# Altium footprint library 5-C-THD.PcbLib: 166 footprints (part 9 of 11)
Each footprint in its own frame and in the unit in brackets; x right, y up, seen from the top. Pads: shape width x height; smd on the part's side, far side on the other; paste and mask are expansions set on the pad; w line width, h text height; cw(c..) or ccw(c..) is an arc to the next point about the centre after c.
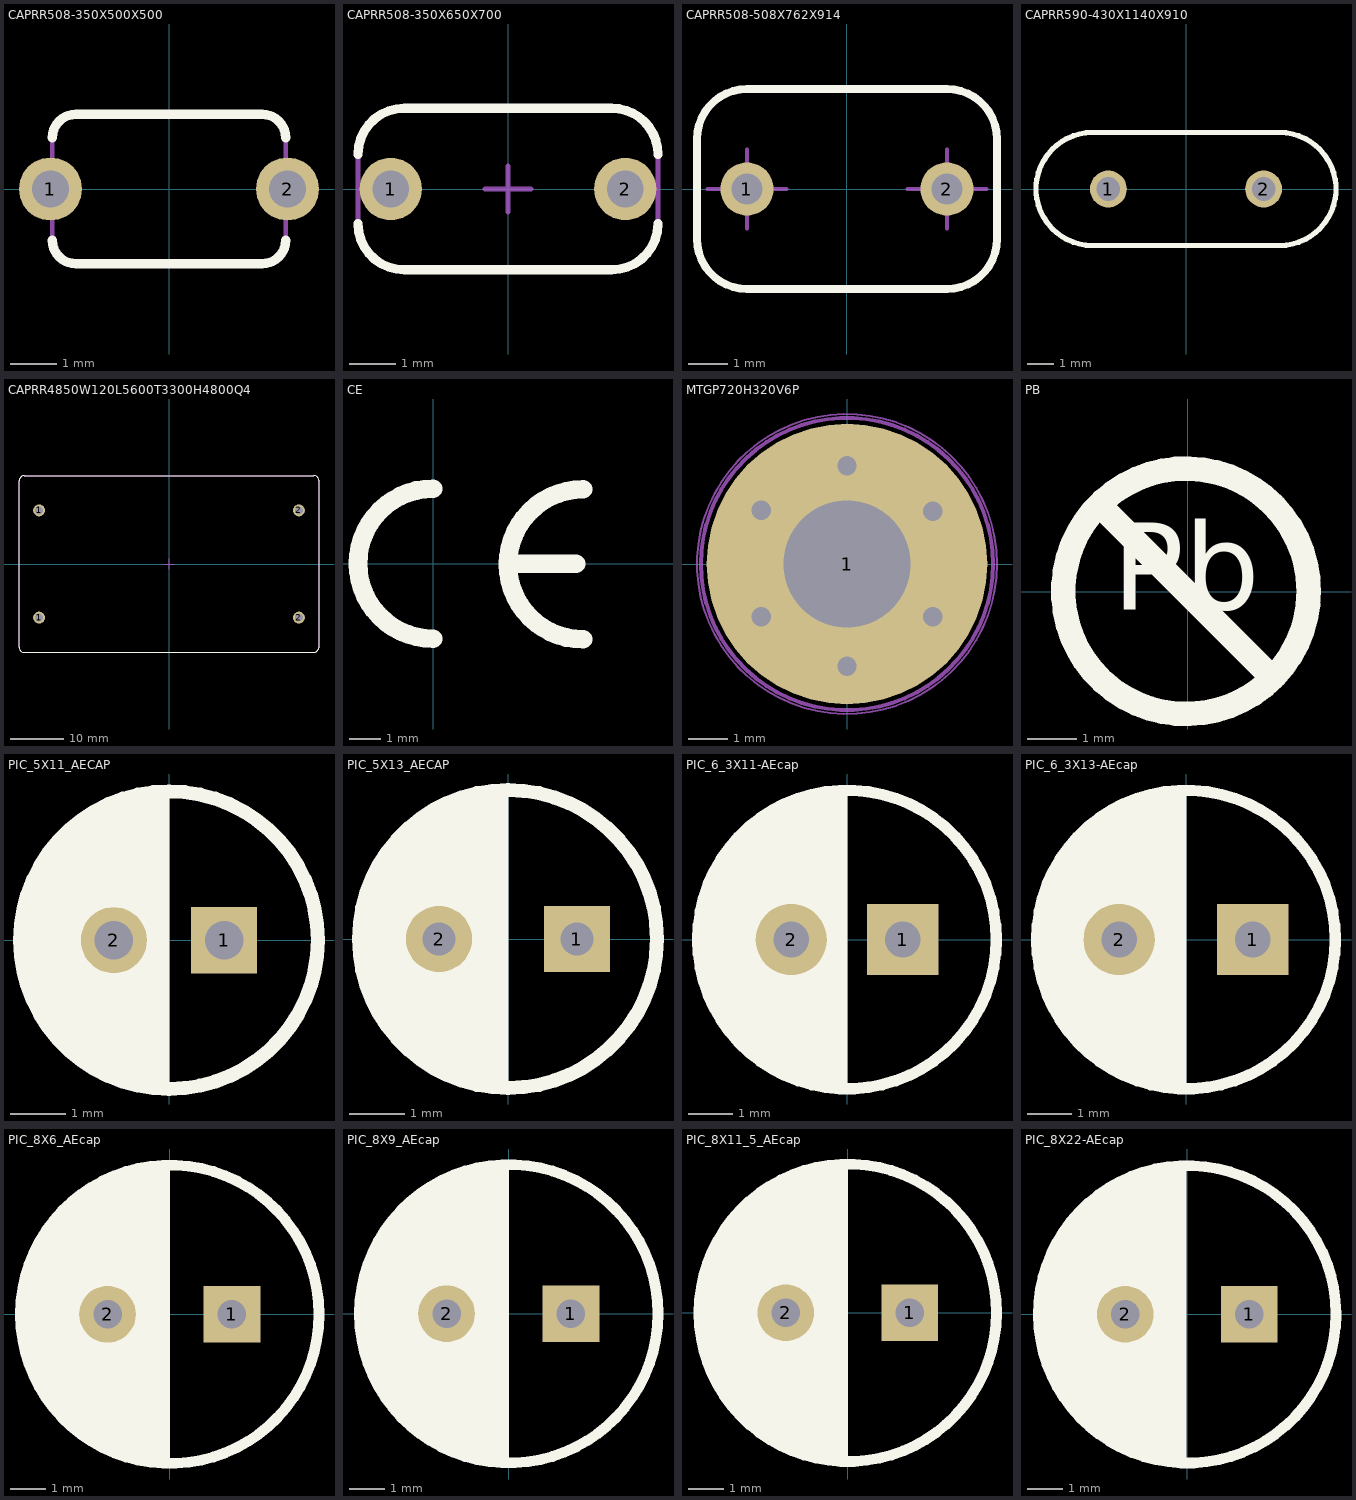
[diagram p8: the footprints below, top view; thin cyan lines are the x and y axes]

## CAPRR508-350X500X500 [mm] "Capacitor Radial Rounded, Pin spacing 5.08mm - Body With 3.2mm X Body Length 5.0mm X Body Height 5.0mm"
height 5
pads (2):
  round 1.35 hole 0.8: 1(-2.54,0) 2(2.54,0)
Top Overlay:
  lines w0.2: -2.5,-1.1 ccw(c-2,-1.1) -2,-1.6 2,-1.6 ccw(c2,-1.1) 2.5,-1.1 ; -2.5,1.1 cw(c-2,1.1) -2,1.6 2,1.6 cw(c2,1.1) 2.5,1.1
Mechanical 13:
  lines w0.1: -2.5,-1.1 ccw(c-2,-1.1) -2,-1.6 2,-1.6 ccw(c2,-1.1) 2.5,-1.1 2.5,1.1 ccw(c2,1.1) 2,1.6 -2,1.6 ccw(c-2,1.1) -2.5,1.1 -2.5,-1.1
Mechanical 14:
  lines w0.1: -2.5,-1.1 ccw(c-2,-1.1) -2,-1.6 2,-1.6 ccw(c2,-1.1) 2.5,-1.1 2.5,1.1 ccw(c2,1.1) 2,1.6 -2,1.6 ccw(c-2,1.1) -2.5,1.1 -2.5,-1.1
3D body "v150-080.stp": height 0.02, standoff -1.65, extent 1.79,-0.75 3.29,0.75
3D body "v150-080.stp": height 0.02, standoff -1.65, extent -3.29,-0.75 -1.79,0.75
3D body "CAPRR508-350X500X500.stp": height 5, standoff -1.94, extent -2.79,-1.75 2.79,1.75

## CAPRR508-350X650X700 [mm] "Capacitor Radial Rounded, Pin spacing 5.08mm - Body With 3.5mm X Body Length 6.5mm X Body Height 7mm"
height 7
pads (2):
  round 1.35 hole 0.8: 1(-2.54,0) 2(2.54,0)
Top Overlay:
  lines w0.2: -3.25,-0.75 ccw(c-2.25,-0.75) -2.25,-1.75 2.25,-1.75 ccw(c2.25,-0.75) 3.25,-0.75 ; -3.25,0.75 cw(c-2.25,0.75) -2.25,1.75 2.25,1.75 cw(c2.25,0.75) 3.25,0.75
Mechanical 8:
  lines w0.1: -3.04,0 -2.54,0 ; -2.54,-0.5 -2.54,0 ; -2.54,0.5 -2.54,0 ; -2.04,0 -2.54,0 ; -0.5,0 0,0 ; 0,-0.5 0,0 ; 0,0.5 0,0 ; 0.5,0 0,0 ; 2.04,0 2.54,0 ; 2.54,-0.5 2.54,0 ; 2.54,0.5 2.54,0 ; 3.04,0 2.54,0
Mechanical 14:
  lines w0.1: -3.25,-0.75 ccw(c-2.25,-0.75) -2.25,-1.75 2.25,-1.75 ccw(c2.25,-0.75) 3.25,-0.75 3.25,0.75 ccw(c2.25,0.75) 2.25,1.75 -2.25,1.75 ccw(c-2.25,0.75) -3.25,0.75 -3.25,-0.75
3D body "v150-080.stp": height 0.02, standoff -1.65, extent -3.29,-0.75 -1.79,0.75
3D body "v150-080.stp": height 0.02, standoff -1.65, extent 1.79,-0.75 3.29,0.75
3D body "CAPRR508-350X650X700.stp": height 7, standoff -3.6, extent -3.25,-1.75 3.25,1.75

## CAPRR508-508X762X914 [mm] "Capacitor Radial Rounded, Pin spacing 5.08mm - Body With 5.08mm X Body Length 7.62mm X Body Height 9.14mm"
height 9.14
pads (2):
  round 1.35 hole 0.8: 1(-2.54,0) 2(2.54,0)
Top Overlay:
  lines w0.2: -3.81,-1.27 ccw(c-2.54,-1.27) -2.54,-2.54 2.54,-2.54 ccw(c2.54,-1.27) 3.81,-1.27 3.81,1.27 ccw(c2.54,1.27) 2.54,2.54 -2.54,2.54 ccw(c-2.54,1.27) -3.81,1.27 -3.81,-1.27
Mechanical 8:
  lines w0.1: -3.54,0 -2.54,0 ; -2.54,-1 -2.54,0 ; -2.54,1 -2.54,0 ; -1.54,0 -2.54,0 ; 1.54,0 2.54,0 ; 2.54,-1 2.54,0 ; 2.54,1 2.54,0 ; 3.54,0 2.54,0
Mechanical 14:
  lines w0.1: -3.81,-1.27 ccw(c-2.54,-1.27) -2.54,-2.54 2.54,-2.54 ccw(c2.54,-1.27) 3.81,-1.27 3.81,1.27 ccw(c2.54,1.27) 2.54,2.54 -2.54,2.54 ccw(c-2.54,1.27) -3.81,1.27 -3.81,-1.27
3D body "v150-080.stp": height 0.02, standoff -1.65, extent 1.79,-0.75 3.29,0.75
3D body "v150-080.stp": height 0.02, standoff -1.65, extent -3.29,-0.75 -1.79,0.75
3D body "CAPRR508-508X762X914.stp": height 9.14, standoff -3.4, extent -3.81,-2.54 3.81,2.54

## CAPRR590-430X1140X910 [mm] "Capacitor Radial Rounded, Pin spacing 5.9mm - Body With 4.3mm X Body Length 11.4mm X Body Height 9.1mm"
height 9.1
pads (2):
  round 1.4 hole 0.9: 1(-2.95,0) 2(2.95,0)
Top Overlay:
  lines w0.2: -3.55,-2.15 cw(c-3.55,0) -3.55,2.15 3.55,2.15 cw(c3.55,0) 3.55,-2.15 -3.55,-2.15
Mechanical 14:
  lines w0.1: -3.55,-2.15 cw(c-3.55,0) -3.55,2.15 3.55,2.15 cw(c3.55,0) 3.55,-2.15 -3.55,-2.15
3D body "CAPRR590-430X1140X910.stp": height 10.95, standoff -4, extent -5.7,-2.15 5.7,2.15
3D body "v150-080.stp": height 0.02, standoff -1.65, extent 2.2,-0.75 3.7,0.75
3D body "v150-080.stp": height 0.02, standoff -1.65, extent -3.7,-0.75 -2.2,0.75

## CAPRR4850W120L5600T3300H4800Q4 [mm] "Capacitor Non Polarized Radial Rectangular, 4 Pin, Lead spacing 48.5mm - Body Length 56mm X Body Thickness 33mm X Body Height 48mm"
height 48
pads (4):
  round 2.2 hole 1.5: 1(-24.25,-10) 1(-24.25,10) 2(24.25,-10) 2(24.25,10)
Top Overlay:
  lines w0.2: -28,-15.5 ccw(c-27,-15.5) -27,-16.5 27,-16.5 ccw(c27,-15.5) 28,-15.5 28,15.5 ccw(c27,15.5) 27,16.5 -27,16.5 ccw(c-27,15.5) -28,15.5 -28,-15.5
Mechanical 8:
  lines w0.1: -25.25,-10 -24.25,-10 ; -25.25,10 -24.25,10 ; -24.25,-11 -24.25,-10 ; -24.25,-9 -24.25,-10 ; -24.25,9 -24.25,10 ; -24.25,11 -24.25,10 ; -23.25,-10 -24.25,-10 ; -23.25,10 -24.25,10 ; -1,0 0,0 ; 0,-1 0,0 ; 0,1 0,0 ; 1,0 0,0 ; 23.25,-10 24.25,-10 ; 23.25,10 24.25,10 ; 24.25,-11 24.25,-10 ; 24.25,-9 24.25,-10 ; 24.25,9 24.25,10 ; 24.25,11 24.25,10 ; 25.25,-10 24.25,-10 ; 25.25,10 24.25,10
Mechanical 14:
  lines w0.1: -28,-15.5 ccw(c-27,-15.5) -27,-16.5 27,-16.5 ccw(c27,-15.5) 28,-15.5 28,15.5 ccw(c27,15.5) 27,16.5 -27,16.5 ccw(c-27,15.5) -28,15.5 -28,-15.5
3D body "CAPRR4850W120L5600T3300H4800Q4.stp": height 48, standoff -3.8, extent -28,-16.5 28,16.5

## CE [mm]
Top Overlay:
  lines w0.6: 0,-2.413 cw(c0,0) 0,2.413 ; 2.53,0 4.6,0 ; 4.826,-2.438 cw(c4.826,-0.025) 4.826,2.388
3D body "ce.stp": height 0.02, standoff 0, extent -2.725,-2.725 4.82,2.725

## MTGP720H320V6P [mm]
pads (1):
  round 7.2 hole 3.25: 1(0,0)
via -2.2,-1.35 diameter 1 hole 0.5
via -2.2,1.375 diameter 1 hole 0.5
via 0,2.525 diameter 1 hole 0.5
via 2.2,1.35 diameter 1 hole 0.5
via 0,-2.625 diameter 1 hole 0.5
via 2.2,-1.35 diameter 1 hole 0.5
Mechanical 8:
  circle w0.1: c0,0 r2.6
  circle w0.1: c0,0 r3.75
  lines w0.1: -2.657,1.625 -2.224,1.375 ; -2.632,-1.6 -2.199,-1.35 ; -2.474,0.942 -2.224,1.375 ; -2.449,-0.917 -2.199,-1.35 ; -1.974,1.808 -2.224,1.375 ; -1.949,-1.783 -2.199,-1.35 ; -1.791,1.125 -2.224,1.375 ; -1.766,-1.1 -2.199,-1.35 ; -0.5,-2.625 0,-2.625 ; -0.5,0 0,0 ; -0.5,2.525 0,2.525 ; 0,-3.125 0,-2.625 ; 0,-2.125 0,-2.625 ; 0,-0.5 0,0 ; 0,0.5 0,0 ; 0,2.025 0,2.525 ; 0,3.025 0,2.525 ; 0.5,-2.625 0,-2.625 ; 0.5,0 0,0 ; 0.5,2.525 0,2.525 ; 1.766,-1.1 2.199,-1.35 ; 1.766,1.1 2.199,1.35 ; 1.949,-1.783 2.199,-1.35 ; 1.949,1.783 2.199,1.35 ; 2.449,-0.917 2.199,-1.35 ; 2.449,0.917 2.199,1.35 ; 2.632,-1.6 2.199,-1.35 ; 2.632,1.6 2.199,1.35
Mechanical 14:
  circle w0.1: c0,0 r3.75
Mechanical 15:
  circle w0.05: c0,0 r3.85
3D body "mtgp720h320v6p.stp": height 0.1, standoff -1.75, extent -3.627,-3.627 3.628,3.628

## PB [mm]
Top Overlay:
  circle w0.5: c-0.031,0.013 r2.5
  lines w0.5: -1.737,1.719 1.675,-1.693
  text "Pb" at -1.536,-0.948 h3.05
3D body "pb.stp": height 0.02, standoff 0, extent -2.725,-2.725 2.725,2.725

## PIC_5X11_AECAP [mm]
height 45
pads (2):
  rect 1.2x1.2 hole 0.7 mask+0.051: 1(1,0)
  round 1.2 hole 0.7 mask+0.051: 2(-1,0)
Top Overlay:
  circle w0.254: c0,0 r2.7
  region: 0,-2.692 -1.016,-2.489 -1.854,-1.956 -2.438,-1.143 -2.692,-0.152 -2.642,0.762 -2.108,1.753 -1.448,2.311 -0.787,2.642 -0.178,2.743 0,2.718
3D body "pic_5x11-aecap.stp": height 11, standoff -2.24, extent -2.505,-2.51 2.5,2.49

## PIC_5X13_AECAP [mm]
height 45
pads (2):
  rect 1.2x1.2 hole 0.6 mask+0.051: 1(1.25,0)
  round 1.2 hole 0.6 mask+0.051: 2(-1.25,0)
Top Overlay:
  circle w0.254: c0,0 r2.7
  region: 0,-2.718 -1.016,-2.515 -1.854,-1.981 -2.438,-1.168 -2.692,-0.178 -2.642,0.737 -2.108,1.727 -1.448,2.286 -0.787,2.616 -0.178,2.718 0,2.692
3D body "pic_5x13_paecap.stp": height 13, standoff -2.35, extent -2.512,-2.49 2.492,2.51

## PIC_6_3X11-AEcap [mm]
height 45
pads (2):
  rect 1.6x1.6 hole 0.8 mask+0.051: 1(1.25,0)
  round 1.6 hole 0.8 mask+0.051: 2(-1.25,0)
Top Overlay:
  circle w0.254: c0,0 r3.35
  region: 0,-3.353 -1.397,-3.073 -2.184,-2.565 -2.718,-2.007 -2.997,-1.473 -3.302,-0.559 -3.327,0.559 -2.997,1.524 -2.438,2.311 -1.93,2.819 -1.016,3.226 -0.279,3.353 0,3.378
3D body "pic_6_3x11-aecap.stp": height 11, standoff -2.31, extent -3.17,-3.15 3.14,3.15

## PIC_6_3X13-AEcap [mm]
height 45
pads (2):
  rect 1.6x1.6 hole 0.8 mask+0.051: 1(1.5,0)
  round 1.6 hole 0.8 mask+0.051: 2(-1.5,0)
Top Overlay:
  circle w0.254: c0,0 r3.35
  region: 0,-3.353 -1.397,-3.073 -2.184,-2.565 -2.718,-2.007 -2.997,-1.473 -3.302,-0.559 -3.327,0.559 -2.997,1.524 -2.438,2.311 -1.93,2.819 -1.016,3.226 -0.279,3.353 0,3.378
3D body "pic_6_3x13_paecap.stp": height 13, standoff -2.24, extent -3.155,-3.14 3.155,3.16

## PIC_8X6_AEcap [mm]
height 45
pads (2):
  rect 1.6x1.6 hole 0.8 mask+0.051: 1(1.75,0)
  round 1.6 hole 0.8 mask+0.051: 2(-1.75,0)
Top Overlay:
  circle w0.3: c0,0 r4.2
  region: 0,-4.166 -1.372,-4.013 -2.464,-3.454 -3.378,-2.565 -3.937,-1.575 -4.242,-0.406 -4.089,0.94 -3.531,2.388 -2.642,3.353 -1.651,3.861 -0.508,4.166 0,4.216
3D body "1_6-1_6-0_6-1_8.stp": height 0, standoff -1.8, extent 0.94,-0.82 2.54,0.78
3D body "1_6-1_6-0_6-1_8.stp": height 0, standoff -1.8, extent -2.55,-0.8 -0.95,0.8
3D body "pic_8x6-aecap.stp": height 6, standoff -2.4, extent -4.002,-4.02 4.003,3.98

## PIC_8X9_AEcap [mm]
height 45
pads (2):
  rect 1.6x1.6 hole 0.8 mask+0.051: 1(1.75,0)
  round 1.6 hole 0.8 mask+0.051: 2(-1.75,0)
Top Overlay:
  circle w0.3: c0,0 r4.2
  region: 0,-4.216 -1.372,-4.064 -2.464,-3.505 -3.378,-2.616 -3.937,-1.626 -4.242,-0.457 -4.089,0.889 -3.531,2.337 -2.642,3.302 -1.651,3.81 -0.508,4.115 0,4.166
3D body "pic_8x9-aecap.stp": height 8, standoff -2.3, extent -4.008,-4 4.008,4
3D body "1_6-1_6-0_6-1_8.stp": height 0, standoff -1.8, extent -2.55,-0.8 -0.95,0.8
3D body "1_6-1_6-0_6-1_8.stp": height 0, standoff -1.8, extent 0.95,-0.8 2.55,0.8

## PIC_8X11_5_AEcap [mm]
height 45
pads (2):
  rect 1.6x1.6 hole 0.8 mask+0.051: 1(1.75,0)
  round 1.6 hole 0.8 mask+0.051: 2(-1.75,0)
Top Overlay:
  circle w0.3: c0,0 r4.2
  region: 0,-4.267 -1.372,-4.115 -2.464,-3.556 -3.378,-2.667 -3.937,-1.676 -4.242,-0.508 -4.089,0.838 -3.531,2.286 -2.642,3.251 -1.651,3.759 -0.508,4.064 0,4.115
3D body "pic_8x11_5-aecap.stp": height 11.5, standoff -2.29, extent -4.009,-4.01 4,3.99
3D body "1_6-1_6-0_6-1_8.stp": height -0.95, standoff -2.75, extent -2.55,-0.81 -0.95,0.79
3D body "1_6-1_6-0_6-1_8.stp": height -0.95, standoff -2.75, extent 0.95,-0.81 2.55,0.79

## PIC_8X22-AEcap [mm]
height 45
pads (2):
  rect 1.6x1.6 hole 0.8 mask+0.051: 1(1.75,0)
  round 1.6 hole 0.8 mask+0.051: 2(-1.75,0)
Top Overlay:
  region: -0.025,-4.166 -1.397,-4.013 -2.489,-3.454 -3.404,-2.565 -3.962,-1.575 -4.267,-0.406 -4.115,0.94 -3.556,2.388 -2.667,3.353 -1.676,3.861 -0.533,4.166 -0.025,4.216
  lines w0.3: 4.2,0 cw(c0,0) 4.2,0.025
3D body "1_6-1_6-0_6-1_8.stp": height -0.95, standoff -2.75, extent 0.95,-0.81 2.55,0.79
3D body "1_6-1_6-0_6-1_8.stp": height -0.95, standoff -2.75, extent -2.55,-0.81 -0.95,0.79
3D body "pic_8x22-aecap.stp": height 22, standoff -3.27, extent -3.99,-4 4.02,4